# Altium footprint library General.PcbLib: 246 footprints (part 13 of 16)
Each footprint in its own frame and in the unit in brackets; x right, y up, seen from the top. Pads: shape width x height; smd on the part's side, far side on the other; paste and mask are expansions set on the pad; w line width, h text height; cw(c..) or ccw(c..) is an arc to the next point about the centre after c.
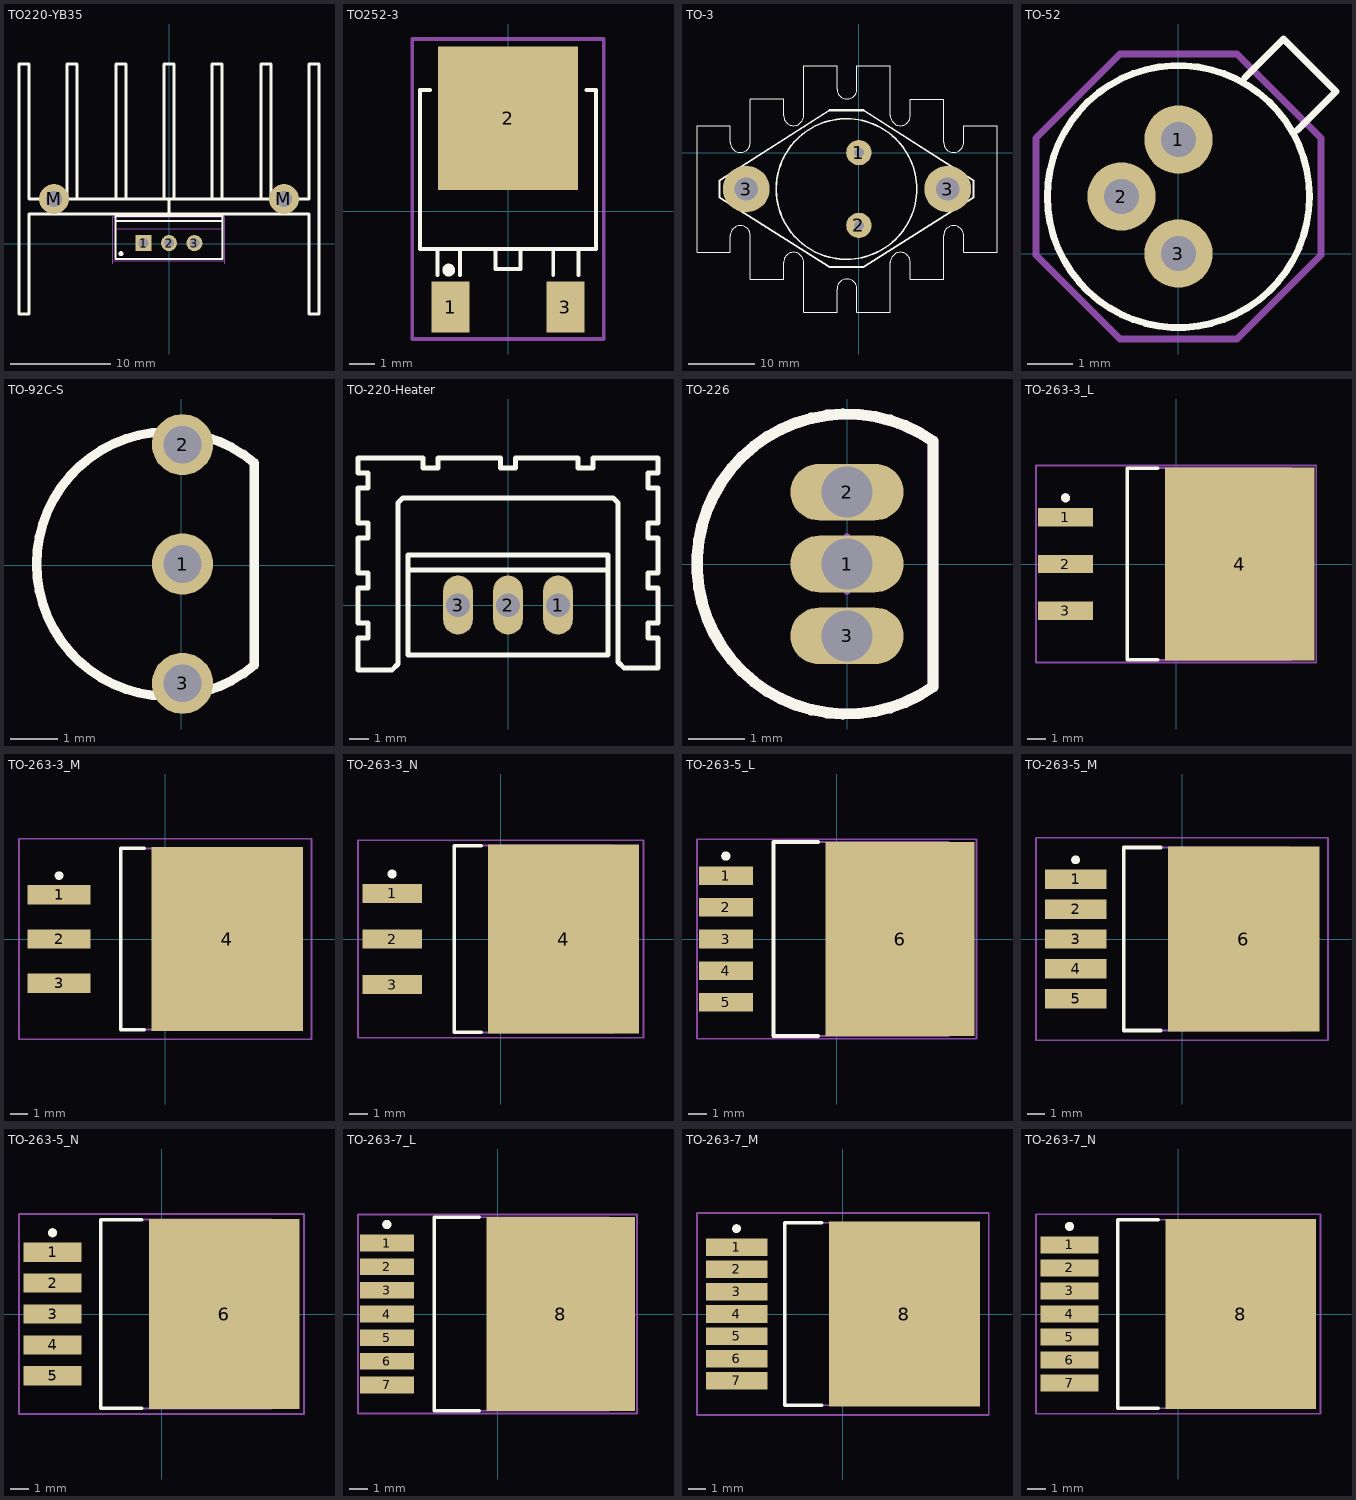
[diagram p12: the footprints below, top view; thin cyan lines are the x and y axes]

## TO220-YB35 [mm] "heat seal 30*25*35mm"
height 0.6
pads (5):
  rect 1.6x1.6 hole 1: 1(-2.54,0.097)
  round 1.6 hole 1: 2(0,0.097) 3(2.54,0.097)
  round 3 hole 1.6: M(-11.5,4.5) M(11.5,4.5)
Top Overlay:
  circle w0.25: c-4.801,-0.97 r0.125
  lines w0.2: -5.35,2.297 5.35,2.297 ; -5.35,-1.503 -5.35,2.797 5.35,2.797 5.35,-1.503 -5.35,-1.503
  lines w0.254: -10.2,4.5 -10.2,8.225 -10.2,18 -9.2,18 -9.2,4.5 ; -5.3,4.525 -5.3,8.25 -5.3,18 -4.3,18 -4.3,4.5 ; -0.5,4.5 -0.5,8.25 -0.5,18 0.5,18 0.5,4.525 ; 0,3 0,4.5 ; 4.3,4.5 4.3,8.225 4.3,18 5.3,18 5.3,4.525 ; 9.2,4.525 9.2,8.25 9.2,18 10.2,18 10.2,4.55 ; -15,-7 -15,18 -14,18 -14,4.5 14,4.5 14,18 15,18 15,-7 14,-7 14,3 -14,3 -14,-7 -15,-7
Mechanical 13:
  lines w0.1: -5.35,1.547 5.35,1.547 ; -5.35,-1.503 5.35,-1.503 5.35,2.797 -5.35,2.797 -5.35,-1.503
Mechanical 15:
  lines w0.05: -5.625,-1.981 -5.625,2.747 5.575,2.747 5.575,-1.981 ; -5.6,-1.681 5.6,-1.681
  lines w0.1: -0.5,0.097 0.5,0.097 ; 0,-0.403 0,0.597
3D body "User Library-Transistors TO-220 3L.STEP": height 19.1, standoff -9.37, extent -5.08,-1.46 5.08,2.891

## TO252-3 [mil] "D2-PAK"
height 184.65
pads (3):
  rect 60x80 smd: 1(-90,-150) 3(90,-150)
  rect 220x225 smd: 2(0,145.67)
Top Overlay:
  circle w10: c-92.92,-92 r5
  lines w6: -122,190 -137.8,190 -137.8,-59.06 137.8,-59.06 137.8,190 123,190 ; -110.24,-99.76 -110.24,-59.29 ; -110,-59.06 -70.87,-59.06 ; -75,-100 -75,-59.06 ; 70.87,-100 70.87,-59.06 110.24,-59.06 110.24,-100 ; -19.68,-90.55 -19.68,-59.06 19.69,-59.06 19.69,-90.55 -19.68,-90.55
Mechanical 13:
  lines w6: -150,-200 -150,270 150,270 150,-200 -150,-200
3D body "DPAK.stp": height 90.94, standoff 0, extent -129.92,-155.55 129.93,226.85

## TO-3 [mm]
pads (4):
  round 3.81 hole 1.5: 1(0,0) 2(0,-10.922)
  round 7 hole 3.5: 3(-16.891,-5.461) 3(13.335,-5.461)
Top Overlay:
  circle w0.254: c-1.854,-5.461 r10.541
  circle w0.254: c-16.891,-5.461 r2.413
  circle w0.254: c13.335,-5.461 r2.413
  lines w0.127: -19.278,-14.961 -24.278,-14.961 -24.278,4.039 -19.279,4.039 -19.279,1.54 ; -19.277,-14.96 -19.277,-12.461 cw(c-17.778,-12.461) -16.279,-12.461 ; -19.277,1.539 ccw(c-17.778,1.539) -16.279,1.539 ; -16.279,8.04 -11.279,8.04 -11.279,5.54 ; -16.278,-12.462 -16.278,-18.961 -11.278,-18.961 ; -16.278,1.539 -16.278,8.039 ; -11.277,-18.96 -11.277,-16.461 cw(c-9.778,-16.461) -8.279,-16.461 ; -11.278,5.539 ccw(c-9.779,5.539) -8.279,5.539 -8.279,13.038 ; -8.278,-16.462 -8.278,-23.961 -3.278,-23.961 ; -8.278,13.039 -3.278,13.039 -3.278,9.539 ccw(c-1.779,9.539) -0.279,9.539 -0.279,13.039 ; -3.277,-23.96 -3.277,-20.461 cw(c-1.778,-20.461) -0.279,-20.461 -0.278,-23.961 4.722,-23.961 ; -0.279,13.04 4.721,13.04 4.721,5.54 ; 4.723,-23.96 4.723,-16.461 cw(c6.222,-16.461) 7.721,-16.461 ; 4.723,5.539 ccw(c6.222,5.539) 7.721,5.539 7.721,8.038 ; 7.722,-16.462 7.722,-18.961 12.722,-18.961 ; 7.722,8.039 12.722,8.039 12.722,1.54 ; 12.723,-18.96 12.723,-12.461 cw(c14.222,-12.461) 15.721,-12.461 15.721,-14.96 ; 12.723,1.539 ccw(c14.222,1.539) 15.721,1.539 15.721,4.038 ; 15.722,-14.961 20.722,-14.961 20.722,4.039 15.722,4.039
  lines w0.305: -20.904,-6.731 -4.394,-17.145 0.686,-17.145 17.196,-6.731 17.196,-4.191 0.686,6.35 -4.394,6.35 -20.904,-4.191 -20.904,-6.731
3D body "User Library-LM317_TO3.STEP": height 8.8, standoff -10.8, extent -21.254,-18.034 17.546,6.966

## TO-52 [mil]
pads (3):
  round 60 hole 31: 1(0,100) 2(-50,50) 3(0,0)
Top Overlay:
  circle w6: c0,50 r115
  lines w6: 58.32,154.32 92.26,188.26 138.26,142.26 104.32,108.32
Mechanical 13:
  circle w0: c0,50 r115
Mechanical 15:
  lines w6: -125,-1.47 -51.47,-75 51.47,-75 125,-1.47 125,101.47 51.47,175 -51.47,175 -125,101.47 -125,-1.47
3D body "H_03_1.stp": height 150, standoff -150, extent -115,-65 125,165

## TO-92C-S [mm]
height 10
pads (3):
  round 1.3 hole 0.8: 1(0.025,0.025) 2(0.025,2.565) 3(0.025,-2.515)
Top Overlay:
  lines w0.2: 1.547,-2.131 cw(c-0.262,0.025) 1.547,2.182 1.547,-2.131
3D body "User Library-TO-92-4.step": height 10.33, standoff -7.7, extent -2.634,-2.863 1.555,2.877

## TO-220-Heater [mm]
pads (3):
  oval 1.5x3 hole 1.2: 1(2.54,0) 2(0,0) 3(-2.54,0)
Top Overlay:
  lines w0.254: -5.08,1.778 5.08,1.778 ; -7.62,-3.3 -5.9,-3.3 -5.588,-2.988 -5.588,5.194 -5.334,5.448 5.334,5.448 5.588,5.194 5.588,-2.888 5.9,-3.2 6.87,-3.2 7.62,-3.2 7.62,-1.664 7.112,-1.664 7.112,-0.902 7.62,-0.902 7.62,0.876 7.112,0.876 7.112,1.638 7.62,1.638 7.62,3.416 7.112,3.416 7.112,4.178 7.62,4.178 7.62,5.956 7.112,5.956 7.112,6.718 7.62,6.718 7.62,7.48 4.318,7.48 4.318,6.972 3.556,6.972 3.556,7.48 0.381,7.48 0.381,6.972 -0.381,6.972 -0.381,7.48 -3.556,7.48 -3.556,6.972 -4.318,6.972 -4.318,7.48 -7.62,7.48 -7.62,6.718 -7.112,6.718 -7.112,5.956 -7.62,5.956 -7.62,4.178 -7.112,4.178 -7.112,3.416 -7.62,3.416 -7.62,1.638 -7.112,1.638 -7.112,0.876 -7.62,0.876 -7.62,-0.902 -7.112,-0.902 -7.112,-1.664 -7.62,-1.664 -7.62,-3.3 ; -5.08,-2.54 5.08,-2.54 5.08,2.54 -5.08,2.54 -5.08,-2.54
3D body "User Library-TO-220-1.STEP": height 20.8, standoff -7.98, extent -4.945,-2.838 4.955,1.662
3D body "SW3dPS-heatsink TO126.STEP": height 25, standoff -3.8, extent -7.381,-3.28 7.401,7.521

## TO-226 [mm] "TO, Flat Index; 3 In-Line, Axial Leads; Body Dia. 4.8mm; Leads 0.55 x 0.51 mm (max)"
pads (3):
  oval 2x1 hole 0.9: 1(0,0) 2(0,1.27) 3(0,-1.27)
Top Overlay:
  lines w0.2: 1.52,-2.171 cw(c0,0) 1.52,2.171 1.52,-2.171
Mechanical 13:
  lines w0.2: 1.52,-2.171 cw(c0,0) 1.52,2.171 1.52,-2.171
Mechanical 15:
  lines w0.1: -0.5,0 0.5,0 ; 0,-0.5 0,0.5
3D body "User Library-TO-92_Str.STEP": height 10, standoff -3, extent -2.613,-2.613 1.59,2.613

## TO-263-3_L [mm] "D2-PAK, 4-Leads, Body 8.6x10.2mm, Pitch 2.54mm, Lead Span 14.2mm, IPC High Density"
height 4.64
pads (4):
  rect 3x1 smd: 1(-6,2.54) 2(-6,0) 3(-6,-2.54)
  rect 8.1x10.45 smd: 4(3.45,0)
Top Overlay:
  circle w0.25: c-6,3.59 r0.125
  lines w0.2: -1,-5.2 -2.65,-5.2 -2.65,5.2 -1,5.2
Mechanical 13:
  lines w0.1: -2.65,-5.2 6.24,-5.2 6.24,5.2 -2.65,5.2 -2.65,-5.2
Mechanical 15:
  lines w0.1: -0.5,0 0.5,0 ; 0,-0.5 0,0.5 ; -7.6,-5.35 7.6,-5.35 7.6,5.35 -7.6,5.35 -7.6,-5.35
3D body "SW3dPS-to-263.STEP": height 4.69, standoff 0, extent -7.105,-5.065 8.335,5.095

## TO-263-3_M [mm] "D2-PAK, 4-Leads, Body 8.6x10.2mm, Pitch 2.54mm, Lead Span 14.2mm, IPC Low Density"
height 4.64
pads (4):
  rect 3.6x1.1 smd: 1(-6.1,2.54) 2(-6.1,0) 3(-6.1,-2.54)
  rect 8.7x10.55 smd: 4(3.55,0)
Top Overlay:
  circle w0.25: c-6.1,3.64 r0.125
  lines w0.2: -1.2,-5.2 -2.55,-5.2 -2.55,5.2 -1.2,5.2
Mechanical 13:
  lines w0.1: -2.55,-5.2 6.34,-5.2 6.34,5.2 -2.55,5.2 -2.55,-5.2
Mechanical 15:
  lines w0.1: -0.5,0 0.5,0 ; 0,-0.5 0,0.5 ; -8.4,-5.75 8.4,-5.75 8.4,5.75 -8.4,5.75 -8.4,-5.75
3D body "SW3dPS-to-263.STEP": height 4.69, standoff 0, extent -7.205,-5.065 8.235,5.095

## TO-263-3_N [mm] "D2-PAK, 4-Leads, Body 8.6x10.2mm, Pitch 2.54mm, Lead Span 14.2mm, IPC Medium Density"
height 4.64
pads (4):
  rect 3.3x1.05 smd: 1(-6.05,2.54) 2(-6.05,0) 3(-6.05,-2.54)
  rect 8.4x10.5 smd: 4(3.5,0)
Top Overlay:
  circle w0.25: c-6.05,3.615 r0.125
  lines w0.2: -1.1,-5.2 -2.6,-5.2 -2.6,5.2 -1.1,5.2
Mechanical 13:
  lines w0.1: -2.6,-5.2 -2.6,5.2 6.29,5.2 6.29,-5.2 -2.6,-5.2
Mechanical 15:
  lines w0.1: -0.5,0 0.5,0 ; 0,-0.5 0,0.5 ; -7.95,-5.5 -7.95,5.5 7.95,5.5 7.95,-5.5 -7.95,-5.5
3D body "SW3dPS-to-263.STEP": height 4.69, standoff 0, extent -7.155,-5.065 8.285,5.095

## TO-263-5_L [mm] "D2-PAK, 6-Leads, Body 8.6x10.2mm, Pitch 1.7mm, Lead Span 14.1mm, IPC High Density"
height 4.65
pads (6):
  rect 2.9x1 smd: 1(-5.95,3.4) 2(-5.95,1.7) 3(-5.95,0) 4(-5.95,-1.7) 5(-5.95,-3.4)
  rect 8x10.4 smd: 6(3.4,0)
Top Overlay:
  circle w0.25: c-5.95,4.45 r0.125
  lines w0.2: -1,-5.2 -3.4,-5.2 -3.4,5.2 -1,5.2
Mechanical 13:
  lines w0.1: -3.4,-5.2 -3.4,5.2 6,5.2 6,-5.2 -3.4,-5.2
Mechanical 15:
  lines w0.1: -0.5,0 0.5,0 ; 0,-0.5 0,0.5 ; -7.5,-5.35 -7.5,5.35 7.5,5.35 7.5,-5.35 -7.5,-5.35
3D body "User Library-TO-263-5.STEP": height 4.56, standoff 0, extent -6.449,-5.08 7.566,5.08

## TO-263-5_M [mm] "D2-PAK, 6-Leads, Body 8.6x10.2mm, Pitch 1.7mm, Lead Span 14.1mm, IPC Low Density"
height 4.65
pads (6):
  rect 3.5x1.1 smd: 1(-6.05,3.4) 2(-6.05,1.7) 3(-6.05,0) 4(-6.05,-1.7) 5(-6.05,-3.4)
  rect 8.6x10.5 smd: 6(3.5,0)
Top Overlay:
  circle w0.25: c-6.05,4.5 r0.125
  lines w0.2: -1.2,-5.2 -3.3,-5.2 -3.3,5.2 -1.2,5.2
Mechanical 13:
  lines w0.1: -3.3,-5.2 6.1,-5.2 6.1,5.2 -3.3,5.2 -3.3,-5.2
Mechanical 15:
  lines w0.1: -0.5,0 0.5,0 ; 0,-0.5 0,0.5 ; -8.3,-5.75 8.3,-5.75 8.3,5.75 -8.3,5.75 -8.3,-5.75
3D body "User Library-TO-263-5.STEP": height 4.56, standoff 0, extent -6.449,-5.08 7.566,5.08

## TO-263-5_N [mm] "D2-PAK, 6-Leads, Body 8.6x10.2mm, Pitch 1.7mm, Lead Span 14.1mm, IPC Medium Density"
height 4.65
pads (6):
  rect 3.2x1.05 smd: 1(-6,3.4) 2(-6,1.7) 3(-6,0) 4(-6,-1.7) 5(-6,-3.4)
  rect 8.3x10.45 smd: 6(3.45,0)
Top Overlay:
  circle w0.25: c-6,4.475 r0.125
  lines w0.2: -1.1,-5.2 -3.35,-5.2 -3.35,5.2 -1.1,5.2
Mechanical 13:
  lines w0.1: -3.35,-5.2 -3.35,5.2 6.05,5.2 6.05,-5.2 -3.35,-5.2
Mechanical 15:
  lines w0.1: -0.5,0 0.5,0 ; 0,-0.5 0,0.5 ; -7.85,-5.5 -7.85,5.5 7.85,5.5 7.85,-5.5 -7.85,-5.5
3D body "User Library-TO-263-5.STEP": height 4.56, standoff 0, extent -6.449,-5.08 7.566,5.08

## TO-263-7_L [mm] "D2-PAK, 8-Leads, Body 8.6x10.2mm, Pitch 1.27mm, Lead Span 14.1mm, IPC High Density"
height 4.64
pads (8):
  rect 2.9x0.9 smd: 1(-5.95,3.81) 2(-5.95,2.54) 3(-5.95,1.27) 4(-5.95,0) 5(-5.95,-1.27) 6(-5.95,-2.54) 7(-5.95,-3.81)
  rect 8x10.45 smd: 8(3.4,0)
Top Overlay:
  circle w0.25: c-5.95,4.81 r0.125
  lines w0.2: -1,-5.2 -3.4,-5.2 -3.4,5.2 -1,5.2
Mechanical 13:
  lines w0.1: -3.4,-5.2 6,-5.2 6,5.2 -3.4,5.2 -3.4,-5.2
Mechanical 15:
  lines w0.1: -0.5,0 0.5,0 ; 0,-0.5 0,0.5 ; -7.5,-5.35 7.5,-5.35 7.5,5.35 -7.5,5.35 -7.5,-5.35
3D body: height 1, standoff 0, extent 7.087,-5.334 8.103,5.334
3D body "SW3dPS-TO263-7-1.STEP": height 4.78, standoff -0.02, extent -7.046,-4.942 8.625,5.058

## TO-263-7_M [mm] "D2-PAK, 8-Leads, Body 8.6x10.2mm, Pitch 1.27mm, Lead Span 14.1mm, IPC Low Density"
height 4.64
pads (8):
  rect 3.5x1 smd: 1(-6.05,3.81) 2(-6.05,2.54) 3(-6.05,1.27) 4(-6.05,0) 5(-6.05,-1.27) 6(-6.05,-2.54) 7(-6.05,-3.81)
  rect 8.6x10.55 smd: 8(3.5,0)
Top Overlay:
  circle w0.25: c-6.05,4.86 r0.125
  lines w0.2: -1.2,-5.2 -3.3,-5.2 -3.3,5.2 -1.2,5.2
Mechanical 13:
  lines w0.1: -3.3,-5.2 6.1,-5.2 6.1,5.2 -3.3,5.2 -3.3,-5.2
Mechanical 15:
  lines w0.1: -0.5,0 0.5,0 ; 0,-0.5 0,0.5 ; -8.3,-5.75 8.3,-5.75 8.3,5.75 -8.3,5.75 -8.3,-5.75
3D body "SW3dPS-TO263-7-1.STEP": height 4.78, standoff -0.02, extent -7.146,-4.942 8.525,5.058

## TO-263-7_N [mm] "D2-PAK, 8-Leads, Body 8.6x10.2mm, Pitch 1.27mm, Lead Span 14.1mm, IPC Medium Density"
height 4.64
pads (8):
  rect 3.2x0.95 smd: 1(-6,3.81) 2(-6,2.54) 3(-6,1.27) 4(-6,0) 5(-6,-1.27) 6(-6,-2.54) 7(-6,-3.81)
  rect 8.3x10.5 smd: 8(3.45,0)
Top Overlay:
  circle w0.25: c-6,4.835 r0.125
  lines w0.2: -1.1,-5.2 -3.35,-5.2 -3.35,5.2 -1.1,5.2
Mechanical 13:
  lines w0.1: -3.35,-5.2 -3.35,5.2 6.05,5.2 6.05,-5.2 -3.35,-5.2
Mechanical 15:
  lines w0.1: -0.5,0 0.5,0 ; 0,-0.5 0,0.5 ; -7.85,-5.5 -7.85,5.5 7.85,5.5 7.85,-5.5 -7.85,-5.5
3D body "SW3dPS-TO263-7-1.STEP": height 4.78, standoff -0.02, extent -7.096,-4.942 8.575,5.058